# Altium footprint library ICs And Semiconductors THD.PcbLib: 350 footprints (part 19 of 22)
Each footprint in its own frame and in the unit in brackets; x right, y up, seen from the top. Pads: shape width x height; smd on the part's side, far side on the other; paste and mask are expansions set on the pad; w line width, h text height; cw(c..) or ccw(c..) is an arc to the next point about the centre after c.
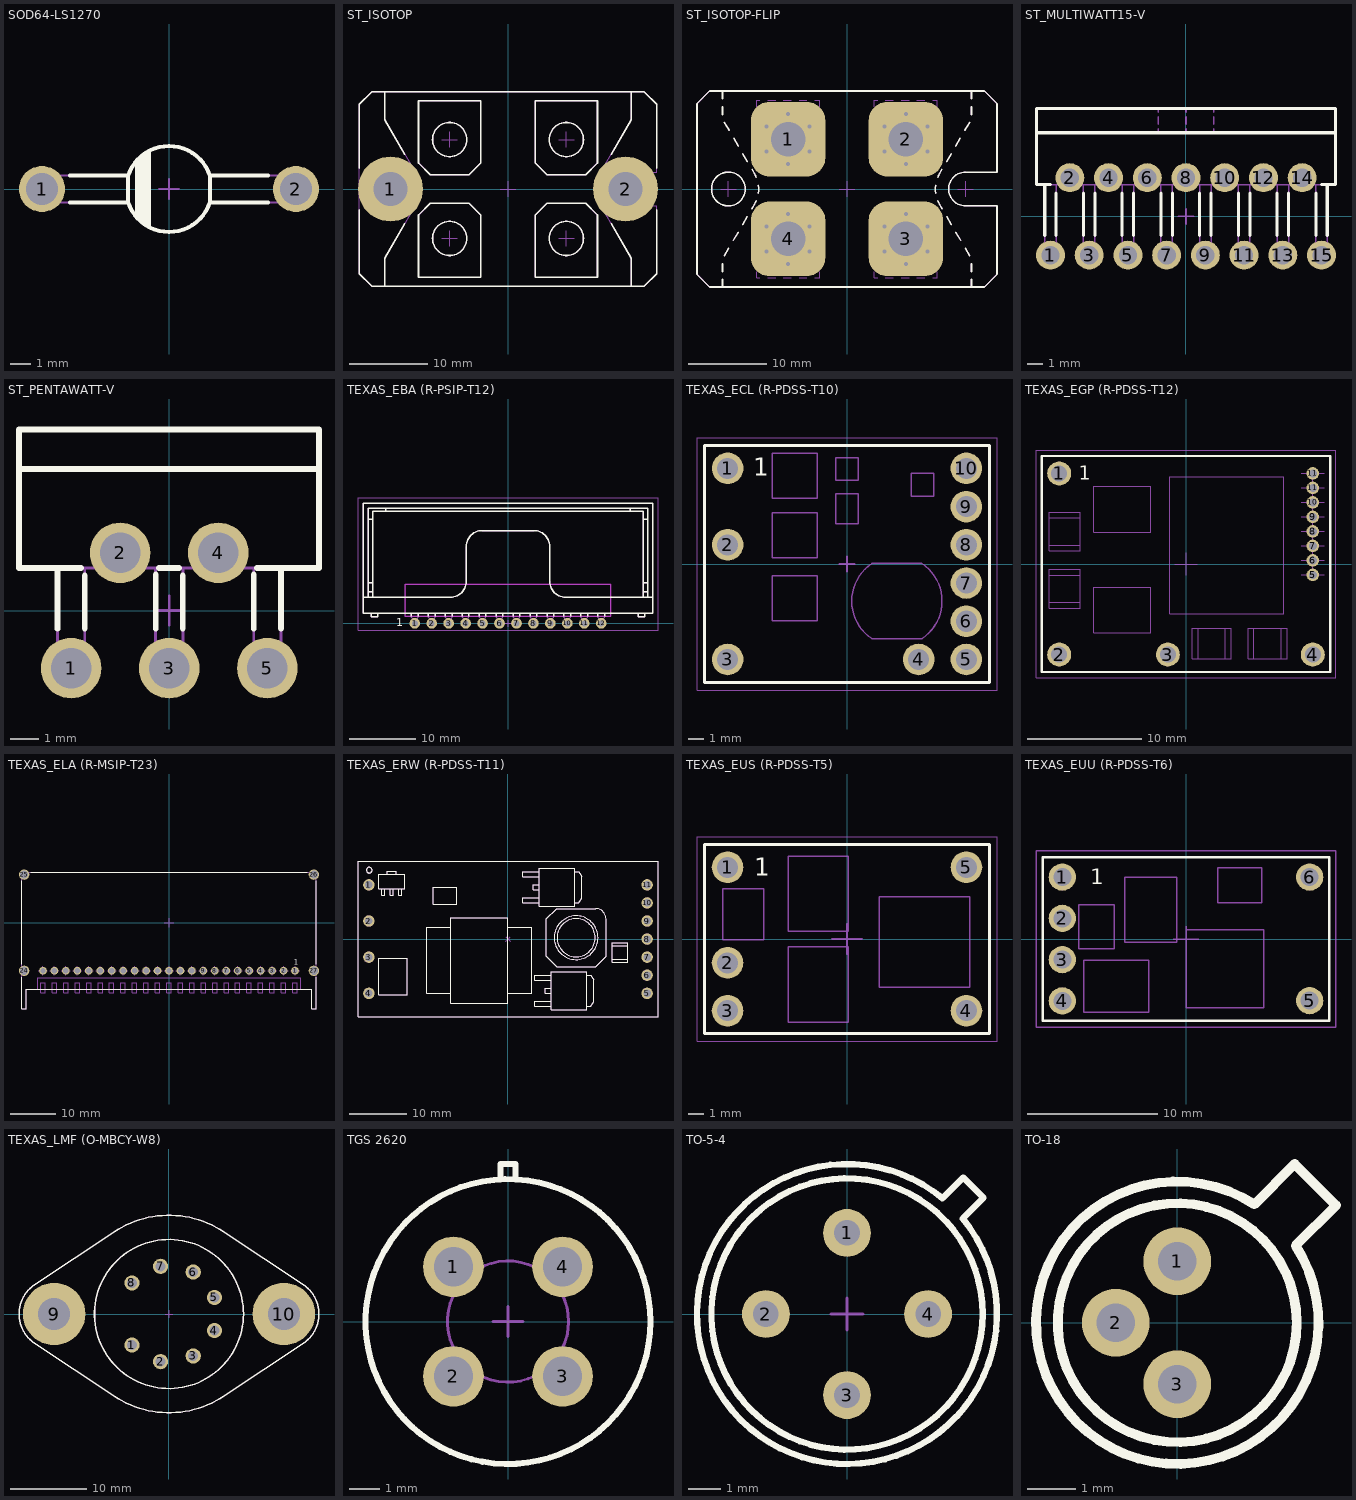
[diagram p18: the footprints below, top view; thin cyan lines are the x and y axes]

## SOD64-LS1270 [mm] "Diode, Axial, Body L 4 x D 4.3mm , Pin spacing 12.7mm"
height 4.85
pads (2):
  round 2.3 hole 1.6: 1(-6.35,0) 2(6.35,0)
Top Overlay:
  lines w0.2: -4.955,-0.675 -2.041,-0.675 ; -4.955,0.675 -2.041,0.675 ; -1.6,-1.436 -1.6,1.436 ; -1.4,-1.632 -1.4,1.632 ; -1.2,-1.784 -1.2,1.784 ; -1,-1.903 -1,1.903 ; 4.955,-0.675 2.041,-0.675 ; 4.955,0.675 2.041,0.675 ; -2.041,-0.675 ccw(c0,0) 2.041,-0.675 ; -2.041,-0.675 -2.041,0.675 ; -2.041,0.675 cw(c0,0) 2.041,0.675 ; 2.041,-0.675 2.041,0.675
Notvisible:
  lines w0.1: -6.85,0 -6.35,0 ; -6.35,-0.5 -6.35,0 ; -6.35,0.5 -6.35,0 ; -5.85,0 -6.35,0 ; -0.5,0 0,0 ; 0,-0.5 0,0 ; 0,0.5 0,0 ; 0.5,0 0,0 ; 5.85,0 6.35,0 ; 6.35,-0.5 6.35,0 ; 6.35,0.5 6.35,0 ; 6.85,0 6.35,0
Mechanical 14:
  lines w0.1: -1.6,-1.436 -1.6,1.436 ; -1.4,-1.632 -1.4,1.632 ; -1.2,-1.784 -1.2,1.784 ; -1,-1.903 -1,1.903 ; -2.041,-0.675 ccw(c0,0) 2.041,-0.675 ; -2.041,-0.675 -2.041,0.675 ; -2.041,-0.675 -6.35,-0.675 cw(c-6.35,0) -6.35,0.675 -2.041,0.675 ; -2.041,0.675 cw(c0,0) 2.041,0.675 ; 2.041,-0.675 6.35,-0.675 ccw(c6.35,0) 6.35,0.675 2.041,0.675 ; 2.041,-0.675 2.041,0.675
3D body "SOD64-LS1270.stp": height 4.85, standoff -2.65, extent -7.025,-2.15 7.025,2.15

## ST_ISOTOP [mm] "STMicroelectronics isotop Case, Body 38mm x 25.5mm, Tab on PCB Version"
height 12.2
pads (2):
  round 8.35 hole 4.4: 1(-15.1,0) 2(15.1,0)
Top Overlay:
  circle w0.2: c-7.5,-6.35 r2.2
  circle w0.2: c7.5,-6.35 r2.2
  circle w0.2: c7.5,6.35 r2.2
  circle w0.2: c-7.5,6.35 r2.2
  lines w0.2: -19.1,-2.698 -19.1,-10.879 -17.5,-12.479 -15.85,-12.479 ; -19.1,2.698 -19.1,10.879 -17.5,12.479 -15.85,12.479 ; -13.247,-4.455 -15.85,-8.9 -15.85,-12.479 ; -13.247,4.455 -15.85,8.9 -15.85,12.479 ; 13.247,-4.455 15.85,-8.9 15.85,-12.479 ; 13.247,4.455 15.85,8.9 15.85,12.479 ; 19.1,-2.698 19.1,-10.879 17.5,-12.479 15.85,-12.479 ; 19.1,2.698 19.1,10.879 17.5,12.479 15.85,12.479 ; -15.85,-12.479 15.85,-12.479 ; -15.85,12.479 15.85,12.479 ; -11.5,-11.314 -11.5,-3.342 ; -11.5,-11.314 -11.5,-3.342 ; -11.5,-11.314 -3.5,-11.314 -3.5,-3.342 ; -11.5,-3.342 -10,-1.842 ; -11.5,-3.342 -10,-1.842 ; -10,-1.842 -5,-1.842 ; -10,-1.842 -5,-1.842 ; -5,-1.842 -3.5,-3.342 ; -5,-1.842 -3.5,-3.342 ; -11.5,3.342 -11.5,11.314 -3.5,11.314 -3.5,3.342 -5,1.842 -10,1.842 -11.5,3.342 ; 3.5,-11.314 3.5,-3.342 5,-1.842 10,-1.842 11.5,-3.342 11.5,-11.314 3.5,-11.314 ; 3.5,3.342 3.5,11.314 11.5,11.314 11.5,3.342 10,1.842 5,1.842 3.5,3.342
Notvisible:
  lines w0.1: -16.1,0 -15.1,0 ; -15.1,-1 -15.1,0 ; -15.1,1 -15.1,0 ; -14.1,0 -15.1,0 ; -8.5,-6.35 -7.5,-6.35 ; -8.5,6.35 -7.5,6.35 ; -7.5,-7.35 -7.5,-6.35 ; -7.5,-5.35 -7.5,-6.35 ; -7.5,5.35 -7.5,6.35 ; -7.5,7.35 -7.5,6.35 ; -6.5,-6.35 -7.5,-6.35 ; -6.5,6.35 -7.5,6.35 ; -1,0 0,0 ; 0,-1 0,0 ; 0,1 0,0 ; 1,0 0,0 ; 6.5,-6.35 7.5,-6.35 ; 6.5,6.35 7.5,6.35 ; 7.5,-7.35 7.5,-6.35 ; 7.5,-5.35 7.5,-6.35 ; 7.5,5.35 7.5,6.35 ; 7.5,7.35 7.5,6.35 ; 8.5,-6.35 7.5,-6.35 ; 8.5,6.35 7.5,6.35 ; 14.1,0 15.1,0 ; 15.1,-1 15.1,0 ; 15.1,1 15.1,0 ; 16.1,0 15.1,0
Mechanical 14:
  circle w0.1: c-15.1,0 r2.15
  circle w0.1: c-7.5,-6.35 r2.2
  circle w0.1: c7.5,-6.35 r2.2
  circle w0.1: c7.5,6.35 r2.2
  circle w0.1: c-7.5,6.35 r2.2
  lines w0.1: -15.85,-12.479 -15.85,-8.9 -11.778,-1.945 ccw(c-15.1,0) -11.778,1.945 -15.85,8.9 -15.85,12.479 ; -15.85,-12.479 15.85,-12.479 ; -15.85,-12.479 -17.5,-12.479 -19.1,-10.879 -19.1,10.879 -17.5,12.479 -15.85,12.479 ; -15.85,12.479 17.5,12.479 ; -11.5,-11.314 -11.5,-3.342 ; -11.5,-11.314 -11.5,-3.342 ; -11.5,-11.314 -3.5,-11.314 -3.5,-3.342 ; -11.5,-3.342 -10,-1.842 ; -11.5,-3.342 -10,-1.842 ; -10,-1.842 -5,-1.842 ; -10,-1.842 -5,-1.842 ; -5,-1.842 -3.5,-3.342 ; -5,-1.842 -3.5,-3.342 ; 15.85,-12.479 15.85,-8.9 11.778,-1.945 cw(c15.1,0) 11.778,1.945 15.85,8.9 15.85,12.479 17.5,12.479 ; 15.85,-12.479 17.5,-12.479 19.1,-10.879 19.1,-2.15 15.1,-2.15 cw(c15.1,0) 15.1,2.15 19.1,2.15 19.1,10.879 17.5,12.479 ; -11.5,3.342 -11.5,11.314 -3.5,11.314 -3.5,3.342 -5,1.842 -10,1.842 -11.5,3.342 ; 3.5,-11.314 3.5,-3.342 5,-1.842 10,-1.842 11.5,-3.342 11.5,-11.314 3.5,-11.314 ; 3.5,3.342 3.5,11.314 11.5,11.314 11.5,3.342 10,1.842 5,1.842 3.5,3.342
3D body "ISOTOP.stp": height 12.04, standoff 0, extent -19.1,-12.479 19.1,12.479

## ST_ISOTOP-FLIP [mm] "STMicroelectronics isotop Case, Body 38mm x 25.5mm, Screws on PCB Version"
height 12.2
pads (4):
  rrect50% 9.5x9.5 hole 4.4: 1(-7.5,6.35) 2(7.5,6.35) 3(7.5,-6.35) 4(-7.5,-6.35)
via -4.75,-4.763 diameter 1 hole 0.5
via -7.5,-3.175 diameter 1 hole 0.5
via -10.25,-4.763 diameter 1 hole 0.5
via -10.25,-7.938 diameter 1 hole 0.5
via -7.5,-9.525 diameter 1 hole 0.5
via -4.75,-7.938 diameter 1 hole 0.5
via 10.25,-4.763 diameter 1 hole 0.5
via 7.5,-3.175 diameter 1 hole 0.5
via 4.75,-4.763 diameter 1 hole 0.5
via 4.75,-7.938 diameter 1 hole 0.5
via 7.5,-9.525 diameter 1 hole 0.5
via 10.25,-7.938 diameter 1 hole 0.5
via -4.75,7.938 diameter 1 hole 0.5
via -7.5,9.525 diameter 1 hole 0.5
via -10.25,7.938 diameter 1 hole 0.5
via -10.25,4.763 diameter 1 hole 0.5
via -7.5,3.175 diameter 1 hole 0.5
via -4.75,4.763 diameter 1 hole 0.5
via 10.25,7.938 diameter 1 hole 0.5
via 7.5,9.525 diameter 1 hole 0.5
via 4.75,7.938 diameter 1 hole 0.5
via 4.75,4.763 diameter 1 hole 0.5
via 7.5,3.175 diameter 1 hole 0.5
via 10.25,4.763 diameter 1 hole 0.5
Top Overlay:
  circle w0.2: c-15.1,0 r2.15
  lines w0.2: -15.85,-11.521 -15.85,-12.479 ; -15.85,-10.521 -15.85,-9.521 ; -15.85,9.479 -15.85,10.479 ; -15.85,11.479 -15.85,12.479 ; -15.628,-8.521 -15.043,-7.521 ; -15.603,8.479 -15.018,7.479 ; -14.457,-6.521 -13.871,-5.521 ; -14.432,6.479 -13.847,5.479 ; -13.286,-4.521 -12.7,-3.521 ; -13.261,4.479 -12.676,3.479 ; -12.115,-2.521 -11.778,-1.945 ccw(c-15.1,0) -11.563,-1.521 ; -12.09,2.479 -11.778,1.945 cw(c-15.1,0) -11.545,1.479 ; -11.285,-0.521 ccw(c-15.1,0) -11.28,0.479 ; 11.28,0.479 ccw(c15.1,0) 11.285,-0.521 ; 11.545,1.479 cw(c15.1,0) 11.778,1.945 12.09,2.479 ; 11.563,-1.521 ccw(c15.1,0) 11.778,-1.945 12.115,-2.521 ; 12.676,3.479 13.261,4.479 ; 12.7,-3.521 13.286,-4.521 ; 13.847,5.479 14.432,6.479 ; 13.871,-5.521 14.457,-6.521 ; 15.018,7.479 15.603,8.479 ; 15.043,-7.521 15.628,-8.521 ; 15.85,-11.521 15.85,-12.479 ; 15.85,-10.521 15.85,-9.521 ; 15.85,9.479 15.85,10.479 ; 15.85,11.479 15.85,12.479 ; -15.85,-12.479 -17.5,-12.479 -19.1,-10.879 -19.1,10.879 -17.5,12.479 -15.85,12.479 ; -15.85,-12.479 15.85,-12.479 ; -15.85,12.479 15.85,12.479 ; 15.1,-2.15 cw(c15.1,0) 15.1,2.15 ; 15.1,-2.15 19.1,-2.15 ; 15.1,-2.15 19.1,-2.15 ; 15.1,2.15 19.1,2.15 ; 15.1,2.15 19.1,2.15 ; 15.85,-12.479 17.5,-12.479 19.1,-10.879 19.1,-2.15 ; 15.85,12.479 17.5,12.479 19.1,10.879 19.1,2.15
Notvisible:
  lines w0.1: -15.1,0 -16.1,0 -15.1,0 ; -15.1,0 -14.1,0 -15.1,0 ; -15.1,0 -15.1,1 -15.1,0 ; -15.1,0 -15.1,-1 -15.1,0 ; -7.5,-6.35 -8.5,-6.35 -7.5,-6.35 ; -7.5,-6.35 -6.5,-6.35 -7.5,-6.35 ; -7.5,-6.35 -7.5,-5.35 -7.5,-6.35 ; -7.5,-6.35 -7.5,-7.35 -7.5,-6.35 ; -7.5,6.35 -8.5,6.35 -7.5,6.35 ; -7.5,6.35 -6.5,6.35 -7.5,6.35 ; -7.5,6.35 -7.5,7.35 -7.5,6.35 ; -7.5,6.35 -7.5,5.35 -7.5,6.35 ; 0,0 -1,0 0,0 ; 0,0 1,0 0,0 ; 0,0 0,1 0,0 ; 0,0 0,-1 0,0 ; 7.5,-6.35 6.5,-6.35 7.5,-6.35 ; 7.5,-6.35 8.5,-6.35 7.5,-6.35 ; 7.5,-6.35 7.5,-5.35 7.5,-6.35 ; 7.5,-6.35 7.5,-7.35 7.5,-6.35 ; 7.5,6.35 6.5,6.35 7.5,6.35 ; 7.5,6.35 8.5,6.35 7.5,6.35 ; 7.5,6.35 7.5,7.35 7.5,6.35 ; 7.5,6.35 7.5,5.35 7.5,6.35 ; 15.1,0 14.1,0 15.1,0 ; 15.1,0 16.1,0 15.1,0 ; 15.1,0 15.1,1 15.1,0 ; 15.1,0 15.1,-1 15.1,0
Mechanical 14:
  circle w0.1: c-15.1,0 r2.15
  circle w0.1: c-7.5,-6.35 r2.2
  circle w0.1: c7.5,-6.35 r2.2
  circle w0.1: c7.5,6.35 r2.2
  circle w0.1: c-7.5,6.35 r2.2
  lines w0.1: -15.85,-11.521 -15.85,-12.479 ; -15.85,-10.521 -15.85,-9.521 ; -15.85,9.479 -15.85,10.479 ; -15.85,11.479 -15.85,12.479 ; -15.628,-8.521 -15.043,-7.521 ; -15.603,8.479 -15.018,7.479 ; -14.457,-6.521 -13.871,-5.521 ; -14.432,6.479 -13.847,5.479 ; -13.286,-4.521 -12.7,-3.521 ; -13.261,4.479 -12.676,3.479 ; -12.115,-2.521 -11.778,-1.945 ccw(c-15.1,0) -11.563,-1.521 ; -12.09,2.479 -11.778,1.945 cw(c-15.1,0) -11.545,1.479 ; -11.5,-10.521 -11.5,-11.314 -11.1,-11.314 ; -11.5,-9.521 -11.5,-8.521 ; -11.5,-7.521 -11.5,-6.521 ; -11.5,-5.521 -11.5,-4.521 ; -11.5,-3.521 -11.5,-3.342 ; -11.5,3.479 -11.5,3.342 -10.637,2.479 ; -11.5,4.479 -11.5,5.479 ; -11.5,6.479 -11.5,7.479 ; -11.5,8.479 -11.5,9.479 ; -11.5,10.479 -11.5,11.314 -11.1,11.314 ; -11.285,-0.521 ccw(c-15.1,0) -11.28,0.479 ; -10.1,-11.314 -9.1,-11.314 ; -10.1,11.314 -9.1,11.314 ; -10,1.842 -9.1,1.842 ; -8.1,-11.314 -7.1,-11.314 ; -8.1,1.842 -7.1,1.842 ; -8.1,11.314 -7.1,11.314 ; -6.1,-11.314 -5.1,-11.314 ; -6.1,1.842 -5.1,1.842 ; -6.1,11.314 -5.1,11.314 ; -5.1,-1.842 -6.1,-1.842 -5,-1.842 ; -4.363,2.479 -3.5,3.342 -3.5,3.479 ; -4.1,-11.314 -3.5,-11.314 -3.5,-10.521 ; -4.1,11.314 -3.5,11.314 -3.5,10.479 ; -3.5,-9.521 -3.5,-8.521 ; -3.5,-7.521 -3.5,-6.521 ; -3.5,-5.521 -3.5,-4.521 ; -3.5,-3.521 -3.5,-3.342 ; -3.5,4.479 -3.5,5.479 ; -3.5,6.479 -3.5,7.479 ; -3.5,8.479 -3.5,9.479 ; 3.5,-10.521 3.5,-11.314 3.9,-11.314 ; 3.5,-9.521 3.5,-8.521 ; 3.5,-7.521 3.5,-6.521 ; 3.5,-5.521 3.5,-4.521 ; 3.5,-3.521 3.5,-3.342 4.321,-2.521 ; 3.5,3.479 3.5,3.342 4.363,2.479 ; 3.5,4.479 3.5,5.479 ; 3.5,6.479 3.5,7.479 ; 3.5,8.479 3.5,9.479 ; 3.5,10.479 3.5,11.314 3.9,11.314 ; 4.9,-11.314 5.9,-11.314 ; 4.9,11.314 5.9,11.314 ; 5,-1.842 5.9,-1.842 ; 5,1.842 5.9,1.842 ; 6.9,-11.314 7.9,-11.314 ; 6.9,-1.842 7.9,-1.842 ; 6.9,1.842 7.9,1.842 ; 6.9,11.314 7.9,11.314 ; 8.9,-11.314 9.9,-11.314 ; 8.9,-1.842 9.9,-1.842 ; 8.9,1.842 9.9,1.842 ; 8.9,11.314 9.9,11.314 ; 10.637,2.479 11.5,3.342 11.5,3.479 ; 10.679,-2.521 11.5,-3.342 11.5,-3.521 ; 10.9,-11.314 11.5,-11.314 11.5,-10.521 ; 10.9,11.314 11.5,11.314 11.5,10.479 ; 11.28,0.479 ccw(c15.1,0) 11.285,-0.521 ; 11.5,-9.521 11.5,-8.521 ; 11.5,-7.521 11.5,-6.521 ; 11.5,-5.521 11.5,-4.521 ; 11.5,4.479 11.5,5.479 ; 11.5,6.479 11.5,7.479 ; 11.5,8.479 11.5,9.479 ; 11.545,1.479 cw(c15.1,0) 11.778,1.945 12.09,2.479 ; 11.563,-1.521 ccw(c15.1,0) 11.778,-1.945 12.115,-2.521 ; 12.676,3.479 13.261,4.479 ; 12.7,-3.521 13.286,-4.521 ; 13.847,5.479 14.432,6.479 ; 13.871,-5.521 14.457,-6.521 ; 15.018,7.479 15.603,8.479 ; 15.043,-7.521 15.628,-8.521 ; 15.85,-11.521 15.85,-12.479 ; 15.85,-10.521 15.85,-9.521 ; 15.85,9.479 15.85,10.479 ; 15.85,11.479 15.85,12.479 ; -15.85,-12.479 15.85,-12.479 ; -15.85,-12.479 -17.5,-12.479 -19.1,-10.879 -19.1,10.879 -17.5,12.479 -15.85,12.479 ; -15.85,12.479 15.85,12.479 ; -11.5,-3.342 -10.679,-2.521 -11.5,-3.342 ; -3.5,-3.342 -4.321,-2.521 -3.5,-3.342 ; 15.1,-2.15 cw(c15.1,0) 15.1,2.15 ; 15.1,-2.15 19.1,-2.15 ; 15.1,-2.15 19.1,-2.15 ; 15.1,2.15 19.1,2.15 ; 15.1,2.15 19.1,2.15 ; 15.85,-12.479 17.5,-12.479 19.1,-10.879 19.1,-2.15 ; 15.85,12.479 17.5,12.479 19.1,10.879 19.1,2.15 ; -10,-1.842 -9.1,-1.842 -10,-1.842 ; -8.1,-1.842 -7.1,-1.842 -8.1,-1.842
3D body "ST_ISOTOP-Flip_Part2.stp": height 10.24, standoff -4.69, extent -11.5,-10.365 11.5,10.365
3D body "ST_ISOTOP-Flip_Part1.stp": height 12.04, standoff 0, extent -19.1,-12.479 19.1,12.479

## ST_MULTIWATT15-V [mm] "ST Microelectronic  15 Leads MULTIWATT Vertical Case"
height 21
pads (15):
  round 1.9 hole 1.2: 1(-8.89,-2.54) 2(-7.62,2.54) 3(-6.35,-2.54) 4(-5.08,2.54) 5(-3.81,-2.54) 6(-2.54,2.54) 7(-1.27,-2.54) 8(0,2.54) 9(1.27,-2.54) 10(2.54,2.54) 11(3.81,-2.54) 12(5.08,2.54) 13(6.35,-2.54) 14(7.62,2.54) 15(8.89,-2.54)
Top Overlay:
  lines w0.2: -9.8,5.49 9.8,5.49 ; -9.265,-1.243 -9.265,2.09 ; -8.893,2.09 -9.8,2.09 -9.8,7.09 0,7.09 9.8,7.09 9.8,2.09 8.893,2.09 ; -8.515,-1.243 -8.515,1.529 ; -6.725,-1.243 -6.725,1.529 ; -5.975,-1.243 -5.975,1.529 ; -4.185,-1.243 -4.185,1.529 ; -3.435,-1.243 -3.435,1.529 ; -1.645,-1.243 -1.645,1.529 ; -0.895,-1.243 -0.895,1.529 ; 0.895,-1.243 0.895,1.529 ; 1.645,-1.243 1.645,1.529 ; 3.435,-1.243 3.435,1.529 ; 4.185,-1.243 4.185,1.529 ; 5.975,-1.243 5.975,1.529 ; 6.725,-1.243 6.725,1.529 ; 8.515,-1.243 8.515,1.529 ; 9.265,-1.243 9.265,2.09
Notvisible:
  lines w0.1: -9.39,-2.54 -8.89,-2.54 ; -8.89,-3.04 -8.89,-2.54 ; -8.89,-2.04 -8.89,-2.54 ; -8.39,-2.54 -8.89,-2.54 ; -8.12,2.54 -7.62,2.54 ; -7.62,2.04 -7.62,2.54 ; -7.62,3.04 -7.62,2.54 ; -7.12,2.54 -7.62,2.54 ; -6.85,-2.54 -6.35,-2.54 ; -6.35,-3.04 -6.35,-2.54 ; -6.35,-2.04 -6.35,-2.54 ; -5.85,-2.54 -6.35,-2.54 ; -5.58,2.54 -5.08,2.54 ; -5.08,2.04 -5.08,2.54 ; -5.08,3.04 -5.08,2.54 ; -4.58,2.54 -5.08,2.54 ; -4.31,-2.54 -3.81,-2.54 ; -3.81,-3.04 -3.81,-2.54 ; -3.81,-2.04 -3.81,-2.54 ; -3.31,-2.54 -3.81,-2.54 ; -3.04,2.54 -2.54,2.54 ; -2.54,2.04 -2.54,2.54 ; -2.54,3.04 -2.54,2.54 ; -2.04,2.54 -2.54,2.54 ; -1.77,-2.54 -1.27,-2.54 ; -1.27,-3.04 -1.27,-2.54 ; -1.27,-2.04 -1.27,-2.54 ; -0.77,-2.54 -1.27,-2.54 ; -0.5,0 0,0 ; -0.5,2.54 0,2.54 ; 0,-0.5 0,0 ; 0,0.5 0,0 ; 0,2.04 0,2.54 ; 0,3.04 0,2.54 ; 0.5,0 0,0 ; 0.5,2.54 0,2.54 ; 0.77,-2.54 1.27,-2.54 ; 1.27,-3.04 1.27,-2.54 ; 1.27,-2.04 1.27,-2.54 ; 1.77,-2.54 1.27,-2.54 ; 2.04,2.54 2.54,2.54 ; 2.54,2.04 2.54,2.54 ; 2.54,3.04 2.54,2.54 ; 3.04,2.54 2.54,2.54 ; 3.31,-2.54 3.81,-2.54 ; 3.81,-3.04 3.81,-2.54 ; 3.81,-2.04 3.81,-2.54 ; 4.31,-2.54 3.81,-2.54 ; 4.58,2.54 5.08,2.54 ; 5.08,2.04 5.08,2.54 ; 5.08,3.04 5.08,2.54 ; 5.58,2.54 5.08,2.54 ; 5.85,-2.54 6.35,-2.54 ; 6.35,-3.04 6.35,-2.54 ; 6.35,-2.04 6.35,-2.54 ; 6.85,-2.54 6.35,-2.54 ; 7.12,2.54 7.62,2.54 ; 7.62,2.04 7.62,2.54 ; 7.62,3.04 7.62,2.54 ; 8.12,2.54 7.62,2.54 ; 8.39,-2.54 8.89,-2.54 ; 8.89,-3.04 8.89,-2.54 ; 8.89,-2.04 8.89,-2.54 ; 9.39,-2.54 8.89,-2.54
Mechanical 14:
  lines w0.1: -9.8,5.49 9.8,5.49 ; -9.265,2.09 -9.265,-2.815 -8.515,-2.816 -8.515,2.09 ; -6.725,2.09 -6.725,-2.815 -5.975,-2.816 -5.975,2.09 ; -4.185,2.09 -4.185,-2.815 -3.435,-2.816 -3.435,2.09 ; -1.825,5.49 -1.825,5.74 ; -1.825,6.04 -1.825,6.29 -1.825,6.54 ; -1.825,6.84 -1.825,7.09 ; -1.645,2.09 -1.645,-2.815 -0.895,-2.816 -0.895,2.09 ; 0,5.49 0,5.74 ; 0,6.04 0,6.29 0,6.54 ; 0,6.84 0,7.09 ; 0.895,2.09 0.895,-2.815 1.645,-2.816 1.645,2.09 ; 1.825,5.49 1.825,5.74 ; 1.825,6.04 1.825,6.29 1.825,6.54 ; 1.825,6.84 1.825,7.09 ; 3.435,2.09 3.435,-2.815 4.185,-2.816 4.185,2.09 ; 5.975,2.09 5.975,-2.815 6.725,-2.816 6.725,2.09 ; 8.515,2.09 8.515,-2.815 9.265,-2.816 9.265,2.09 ; 0,7.09 9.8,7.09 9.8,2.09 -9.8,2.09 -9.8,7.09 0,7.09
3D body "ST_MULTIWATT15-V.stp": height 20.75, standoff -4.4, extent -9.8,-2.815 9.8,7.09

## ST_PENTAWATT-V [mm] "ST Microelectronic  5 Leads PENTAWATT Verttical Case"
height 3.68
pads (5):
  round 2.1 hole 1.4: 1(-3.4,-2) 2(-1.7,2) 3(0,-2) 4(1.7,2) 5(3.4,-2)
Top Overlay:
  lines w0.2: -5.208,4.905 5.192,4.905 ; -3.871,-0.631 -3.871,1.475 ; -3.06,1.475 -5.208,1.475 -5.208,6.275 5.192,6.275 5.192,1.475 3.043,1.475 ; -2.929,-0.626 -2.929,1.218 ; -0.471,-0.631 -0.471,1.244 ; -0.357,1.475 0.34,1.475 ; 0.471,-0.626 0.471,1.218 ; 2.929,-0.631 2.929,1.244 ; 3.871,-0.626 3.871,1.475
Notvisible:
  lines w0.1: -3.9,-2 -3.4,-2 ; -3.4,-2.5 -3.4,-2 ; -3.4,-1.5 -3.4,-2 ; -2.9,-2 -3.4,-2 ; -2.2,2 -1.7,2 ; -1.7,1.5 -1.7,2 ; -1.7,2.5 -1.7,2 ; -1.2,2 -1.7,2 ; -0.5,-2 0,-2 ; -0.5,0 0,0 ; 0,-2.5 0,-2 ; 0,-1.5 0,-2 ; 0,-0.5 0,0 ; 0,0.5 0,0 ; 0.5,-2 0,-2 ; 0.5,0 0,0 ; 1.2,2 1.7,2 ; 1.7,1.5 1.7,2 ; 1.7,2.5 1.7,2 ; 2.2,2 1.7,2 ; 2.9,-2 3.4,-2 ; 3.4,-2.5 3.4,-2 ; 3.4,-1.5 3.4,-2 ; 3.9,-2 3.4,-2
Mechanical 14:
  lines w0.1: -5.208,4.905 5.192,4.905 ; -3.871,1.475 -3.871,-2.225 -2.929,-2.225 -2.929,1.475 ; -0.471,1.475 -0.471,-2.225 0.471,-2.225 0.471,1.475 ; 2.929,1.475 2.929,-2.225 3.871,-2.225 3.871,1.475 ; -5.208,1.475 5.192,1.475 5.192,6.275 -5.208,6.275 -5.208,1.475
3D body "ST_PENTAWATT-V.stp": height 20.85, standoff -4.55, extent -5.208,-2.225 5.192,6.275

## TEXAS_EBA (R-PSIP-T12) [mm] "TEXAS EBA (R-PSIP-T12) Case"
height 9.65
pads (12):
  round 1.6 hole 0.9: 1(-13.97,0) 2(-11.43,0) 3(-8.89,0) 4(-6.35,0) 5(-3.81,0) 6(-1.27,0) 7(1.27,0) 8(3.81,0) 9(6.35,0) 10(8.89,0) 11(11.43,0) 12(13.97,0)
Top Overlay:
  lines w0.2: -21.715,3.91 -8.65,3.91 ccw(c-8.65,6.31) -6.25,6.31 -6.25,11.51 cw(c-3.85,11.51) -3.85,13.91 3.85,13.91 cw(c3.85,11.51) 6.25,11.51 6.25,6.31 ccw(c8.65,6.31) 8.65,3.91 21.715,3.91 ; -20.915,3.91 -20.915,17.22 20.915,17.22 20.915,3.91 ; -20.915,4.77 -20.25,4.77 ; -20.915,6.07 -20.25,6.07 ; -20.915,15.62 -20.25,15.62 ; -20.515,1.51 -20.515,1.01 -19.515,1.01 -19.515,1.51 ; -20.25,3.91 -20.25,16.765 20.25,16.765 20.25,3.91 ; -18.315,16.765 -18.315,17.22 ; -14.47,1.091 -14.47,1.51 ; -13.47,1.091 -13.47,1.51 ; -11.93,1.091 -11.93,1.51 ; -10.93,1.091 -10.93,1.51 ; -9.39,1.091 -9.39,1.51 ; -8.39,1.091 -8.39,1.51 ; -6.85,1.091 -6.85,1.51 ; -5.85,1.091 -5.85,1.51 ; -4.31,1.091 -4.31,1.51 ; -3.31,1.091 -3.31,1.51 ; -1.77,1.091 -1.77,1.51 ; -0.77,1.091 -0.77,1.51 ; 0.77,1.091 0.77,1.51 ; 1.77,1.091 1.77,1.51 ; 3.31,1.091 3.31,1.51 ; 4.31,1.091 4.31,1.51 ; 5.85,1.091 5.85,1.51 ; 6.85,1.091 6.85,1.51 ; 8.39,1.091 8.39,1.51 ; 9.39,1.091 9.39,1.51 ; 10.93,1.091 10.93,1.51 ; 11.93,1.091 11.93,1.51 ; 13.47,1.091 13.47,1.51 ; 14.47,1.091 14.47,1.51 ; 18.315,16.765 18.315,17.22 ; 19.515,1.51 19.515,1.01 20.515,1.01 20.515,1.51 ; 20.25,4.77 20.915,4.77 ; 20.25,6.07 20.915,6.07 ; 20.25,15.62 20.915,15.62 ; -21.715,1.51 -21.715,18.02 21.715,18.02 21.715,1.51 -21.715,1.51
  text "1" at -16.756,-0.458 h1.2
Keep-Out Layer:
  lines w0.2: -15.365,1.06 -15.365,5.84 15.365,5.84 15.365,1.06 -15.365,1.06
Notvisible:
  lines w0.1: -14.47,0 -13.97,0 ; -13.97,-0.5 -13.97,0 ; -13.97,0.5 -13.97,0 ; -13.47,0 -13.97,0 ; -11.93,0 -11.43,0 ; -11.43,-0.5 -11.43,0 ; -11.43,0.5 -11.43,0 ; -10.93,0 -11.43,0 ; -9.39,0 -8.89,0 ; -8.89,-0.5 -8.89,0 ; -8.89,0.5 -8.89,0 ; -8.39,0 -8.89,0 ; -6.85,0 -6.35,0 ; -6.35,-0.5 -6.35,0 ; -6.35,0.5 -6.35,0 ; -5.85,0 -6.35,0 ; -4.31,0 -3.81,0 ; -3.81,-0.5 -3.81,0 ; -3.81,0.5 -3.81,0 ; -3.31,0 -3.81,0 ; -1.77,0 -1.27,0 ; -1.27,-0.5 -1.27,0 ; -1.27,0.5 -1.27,0 ; -0.77,0 -1.27,0 ; -0.5,0 0,0 ; 0,-0.5 0,0 ; 0,0.5 0,0 ; 0.5,0 0,0 ; 0.77,0 1.27,0 ; 1.27,-0.5 1.27,0 ; 1.27,0.5 1.27,0 ; 1.77,0 1.27,0 ; 3.31,0 3.81,0 ; 3.81,-0.5 3.81,0 ; 3.81,0.5 3.81,0 ; 4.31,0 3.81,0 ; 5.85,0 6.35,0 ; 6.35,-0.5 6.35,0 ; 6.35,0.5 6.35,0 ; 6.85,0 6.35,0 ; 8.39,0 8.89,0 ; 8.89,-0.5 8.89,0 ; 8.89,0.5 8.89,0 ; 9.39,0 8.89,0 ; 10.93,0 11.43,0 ; 11.43,-0.5 11.43,0 ; 11.43,0.5 11.43,0 ; 11.93,0 11.43,0 ; 13.47,0 13.97,0 ; 13.97,-0.5 13.97,0 ; 13.97,0.5 13.97,0 ; 14.47,0 13.97,0 ; -15.365,1.06 -15.365,5.84 15.365,5.84 15.365,1.06 -15.365,1.06
Mechanical 14:
  lines w0.1: -21.715,3.91 -8.65,3.91 ccw(c-8.65,6.31) -6.25,6.31 -6.25,11.51 cw(c-3.85,11.51) -3.85,13.91 3.85,13.91 cw(c3.85,11.51) 6.25,11.51 6.25,6.31 ccw(c8.65,6.31) 8.65,3.91 21.715,3.91 ; -20.915,3.91 -20.915,17.22 20.915,17.22 20.915,3.91 ; -20.915,4.77 -20.25,4.77 ; -20.915,6.07 -20.25,6.07 ; -20.915,15.62 -20.25,15.62 ; -20.515,1.51 -20.515,1.01 -19.515,1.01 -19.515,1.51 ; -20.25,3.91 -20.25,16.765 20.25,16.765 20.25,3.91 ; -18.315,16.765 -18.315,17.22 ; -14.47,1.51 -14.47,0.895 -14.185,0.61 -14.185,-0.215 -13.755,-0.215 -13.755,0.61 -13.47,0.895 -13.47,1.51 ; -11.93,1.51 -11.93,0.895 -11.645,0.61 -11.645,-0.215 -11.215,-0.215 -11.215,0.61 -10.93,0.895 -10.93,1.51 ; -9.39,1.51 -9.39,0.895 -9.105,0.61 -9.105,-0.215 -8.675,-0.215 -8.675,0.61 -8.39,0.895 -8.39,1.51 ; -6.85,1.51 -6.85,0.895 -6.565,0.61 -6.565,-0.215 -6.135,-0.215 -6.135,0.61 -5.85,0.895 -5.85,1.51 ; -4.31,1.51 -4.31,0.895 -4.025,0.61 -4.025,-0.215 -3.595,-0.215 -3.595,0.61 -3.31,0.895 -3.31,1.51 ; -1.77,1.51 -1.77,0.895 -1.485,0.61 -1.485,-0.215 -1.055,-0.215 -1.055,0.61 -0.77,0.895 -0.77,1.51 ; 0.77,1.51 0.77,0.895 1.055,0.61 1.055,-0.215 1.485,-0.215 1.485,0.61 1.77,0.895 1.77,1.51 ; 3.31,1.51 3.31,0.895 3.595,0.61 3.595,-0.215 4.025,-0.215 4.025,0.61 4.31,0.895 4.31,1.51 ; 5.85,1.51 5.85,0.895 6.135,0.61 6.135,-0.215 6.565,-0.215 6.565,0.61 6.85,0.895 6.85,1.51 ; 8.39,1.51 8.39,0.895 8.675,0.61 8.675,-0.215 9.105,-0.215 9.105,0.61 9.39,0.895 9.39,1.51 ; 10.93,1.51 10.93,0.895 11.215,0.61 11.215,-0.215 11.645,-0.215 11.645,0.61 11.93,0.895 11.93,1.51 ; 13.47,1.51 13.47,0.895 13.755,0.61 13.755,-0.215 14.185,-0.215 14.185,0.61 14.47,0.895 14.47,1.51 ; 18.315,16.765 18.315,17.22 ; 19.515,1.51 19.515,1.01 20.515,1.01 20.515,1.51 ; 20.25,4.77 20.915,4.77 ; 20.25,6.07 20.915,6.07 ; 20.25,15.62 20.915,15.62 ; -21.715,1.51 -21.715,18.02 21.715,18.02 21.715,1.51 -21.715,1.51
  text "1" at -16.756,-0.458 h1.2
Mechanical 15:
  lines w0.05: -22.475,-1.01 22.475,-1.01 22.475,18.8 -22.475,18.8 -22.475,-1.01